# Altium footprint library Zmod.PcbLib: 129 footprints (part 2 of 9)
Each footprint in its own frame and in the unit in brackets; x right, y up, seen from the top. Pads: shape width x height; smd on the part's side, far side on the other; paste and mask are expansions set on the pad; w line width, h text height; cw(c..) or ccw(c..) is an arc to the next point about the centre after c.
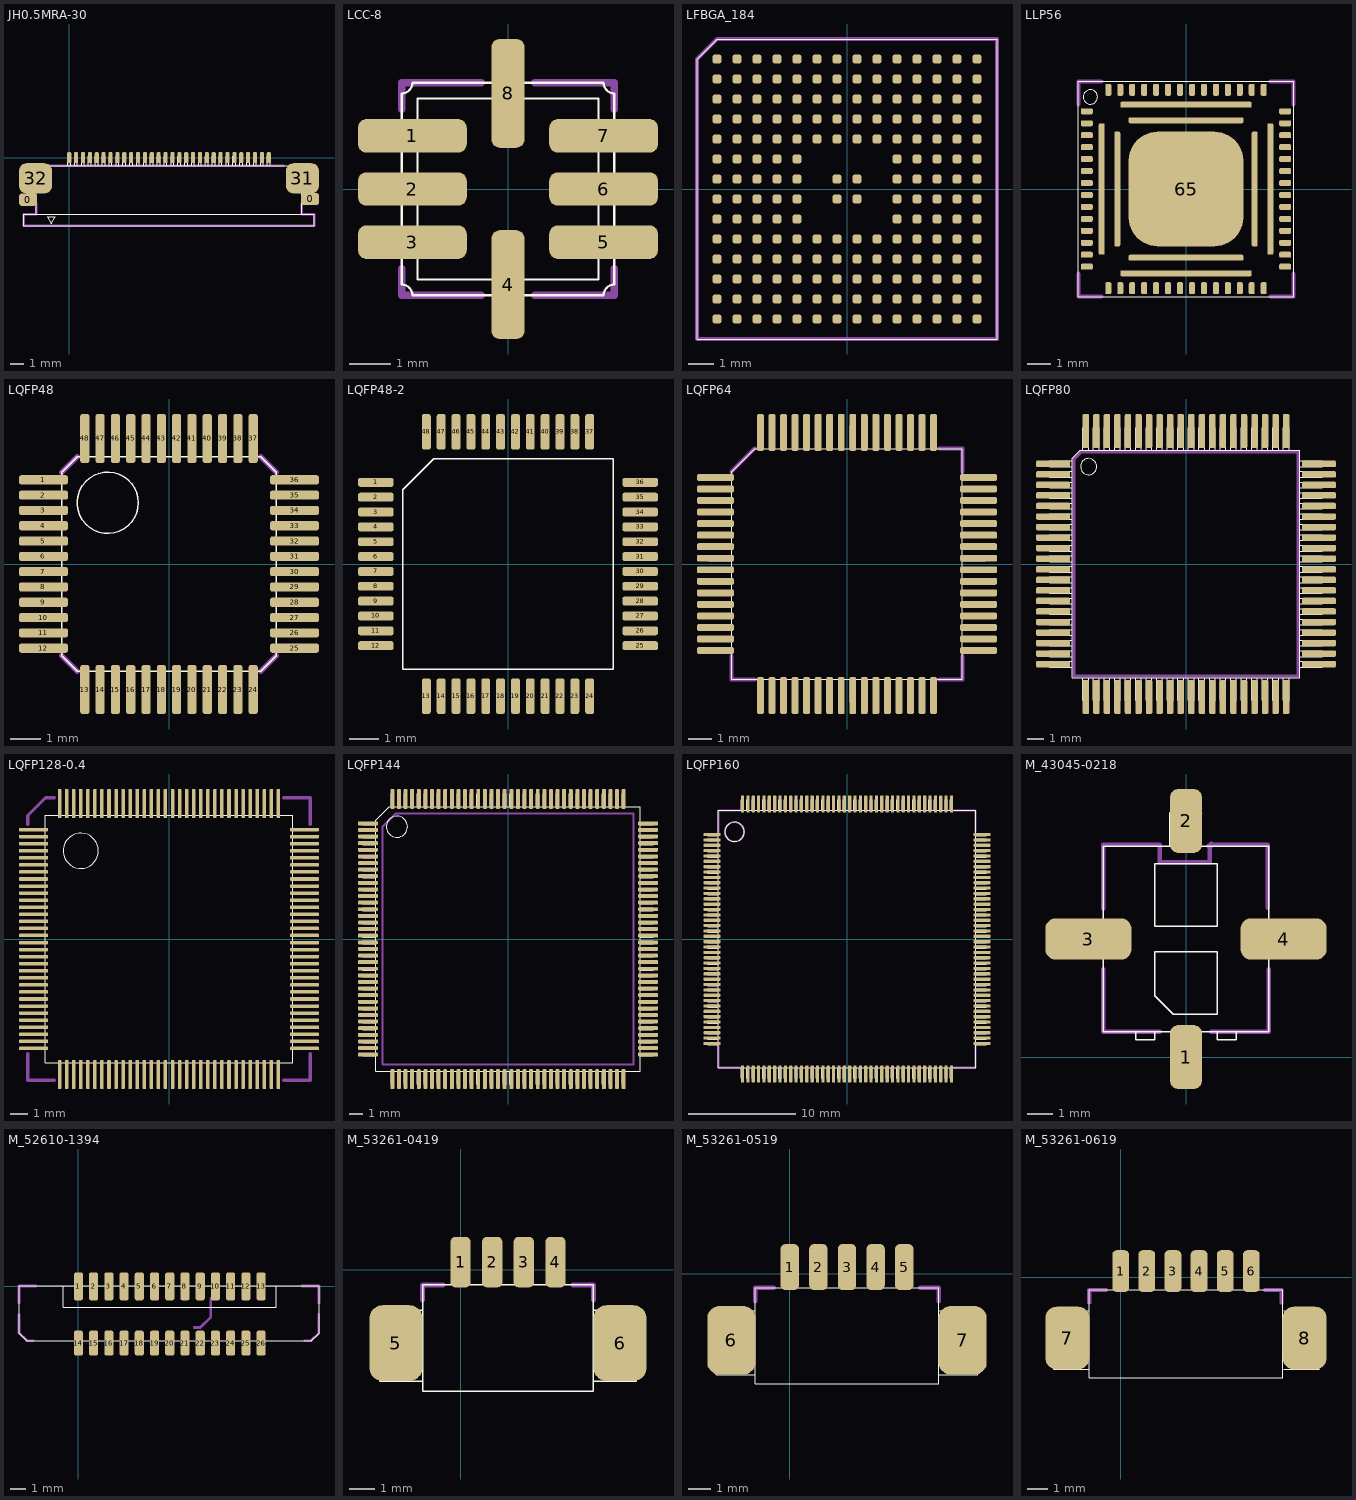
[diagram p1: the footprints below, top view; thin cyan lines are the x and y axes]

## JH0.5MRA-30 [mm]
height 1.778
pads (34):
  rrect50% 1.3x0.9 smd: 0(-3,-3.05) 0(17.5,-3)
  rrect50% 0.3x0.8 smd: 1(0,0) 2(0.5,0) 3(1,0) 4(1.5,0) 5(2,0) 6(2.5,0) 7(3,0) 8(3.5,0) 9(4,0) 10(4.5,0) 11(5,0) 12(5.5,0) 13(6,0) 14(6.5,0) 15(7,0) 16(7.5,0) 17(8,0) 18(8.5,0) 19(9,0) 20(9.5,0) 21(10,0) 22(10.5,0) 23(11,0) 24(11.5,0) 25(12,0) 26(12.5,0) 27(13,0) 28(13.5,0) 29(14,0) 30(14.5,0)
  rrect50% 2.4x2.2 smd: 31(16.95,-1.5) 32(-2.45,-1.5)
Top Overlay:
  lines w0.05: -2.4,-4.1 -2.4,-0.6 16.9,-0.6 16.9,-4.1 ; -2.4,-1.8 -3.1,-1.8 -3.1,-1.6 -2.6,-1.6 -2.6,-1.3 -3.1,-1.3 -3.1,-1.1 -2.6,-1.1 -2.6,-0.7 -2.4,-0.7 ; -0.1,-0.6 -0.1,0.1 0.1,0.1 0.1,-0.6 ; 0.4,-0.6 0.4,0.1 0.6,0.1 0.6,-0.6 ; 0.9,-0.6 0.9,0.1 1.1,0.1 1.1,-0.6 ; 1.4,-0.6 1.4,0.1 1.6,0.1 1.6,-0.6 ; 1.9,-0.6 1.9,0.1 2.1,0.1 2.1,-0.6 ; 2.4,-0.6 2.4,0.1 2.6,0.1 2.6,-0.6 ; 2.9,-0.6 2.9,0.1 3.1,0.1 3.1,-0.6 ; 3.4,-0.6 3.4,0.1 3.6,0.1 3.6,-0.6 ; 3.9,-0.6 3.9,0.1 4.1,0.1 4.1,-0.6 ; 4.4,-0.6 4.4,0.1 4.6,0.1 4.6,-0.6 ; 4.9,-0.6 4.9,0.1 5.1,0.1 5.1,-0.6 ; 5.4,-0.6 5.4,0.1 5.6,0.1 5.6,-0.6 ; 5.9,-0.6 5.9,0.1 6.1,0.1 6.1,-0.6 ; 6.4,-0.6 6.4,0.1 6.6,0.1 6.6,-0.6 ; 6.9,-0.6 6.9,0.1 7.1,0.1 7.1,-0.6 ; 7.4,-0.6 7.4,0.1 7.6,0.1 7.6,-0.6 ; 7.9,-0.6 7.9,0.1 8.1,0.1 8.1,-0.6 ; 8.4,-0.6 8.4,0.1 8.6,0.1 8.6,-0.6 ; 8.9,-0.6 8.9,0.1 9.1,0.1 9.1,-0.6 ; 9.4,-0.6 9.4,0.1 9.6,0.1 9.6,-0.6 ; 9.9,-0.6 9.9,0.1 10.1,0.1 10.1,-0.6 ; 10.4,-0.6 10.4,0.1 10.6,0.1 10.6,-0.6 ; 10.9,-0.6 10.9,0.1 11.1,0.1 11.1,-0.6 ; 11.4,-0.6 11.4,0.1 11.6,0.1 11.6,-0.6 ; 11.9,-0.6 11.9,0.1 12.1,0.1 12.1,-0.6 ; 12.4,-0.6 12.4,0.1 12.6,0.1 12.6,-0.6 ; 12.9,-0.6 12.9,0.1 13.1,0.1 13.1,-0.6 ; 13.4,-0.6 13.4,0.1 13.6,0.1 13.6,-0.6 ; 13.9,-0.6 13.9,0.1 14.1,0.1 14.1,-0.6 ; 14.4,-0.6 14.4,0.1 14.6,0.1 14.6,-0.6 ; 16.9,-1.8 17.6,-1.8 17.6,-1.6 17.1,-1.6 17.1,-1.3 17.6,-1.3 17.6,-1.1 17.1,-1.1 17.1,-0.7 16.9,-0.7 ; -3.3,-4.95 -3.3,-4.1 17.8,-4.1 17.8,-4.95 -3.3,-4.95 ; -1.6,-4.3 -1,-4.3 -1.3,-4.8 -1.6,-4.3
Mechanical 15:
  lines w0.18: -2.4,-3.3 -2.4,-4.1 -3.3,-4.1 -3.3,-4.95 17.8,-4.95 17.8,-4.1 16.9,-4.1 16.9,-3.3 ; -1.65,-0.6 15.55,-0.6
  text ".Designator" at -0.254,-2.794 h1.52

## LCC-8 [mm]
height 1.575
pads (8):
  rrect50% 2.6x0.8 smd paste+0: 1(-2.286,1.27) 2(-2.286,0) 3(-2.286,-1.27) 5(2.286,-1.27) 6(2.286,0) 7(2.286,1.27)
  rrect50% 0.8x2.6 smd paste+0: 4(0,-2.286) 8(0,2.286)
Top Overlay:
  lines w0.05: -2.54,-2.286 cw(c-2.54,-2.54) -2.286,-2.54 -0.254,-2.54 cw(c0,-2.54) 0.254,-2.54 2.286,-2.54 cw(c2.54,-2.54) 2.54,-2.286 2.54,-1.524 cw(c2.54,-1.27) 2.54,-1.016 2.54,-0.254 cw(c2.54,0) 2.54,0.254 2.54,1.016 cw(c2.54,1.27) 2.54,1.524 2.54,2.286 cw(c2.54,2.54) 2.286,2.54 0.254,2.54 cw(c0,2.54) -0.254,2.54 -2.286,2.54 cw(c-2.54,2.54) -2.54,2.286 -2.54,1.524 cw(c-2.54,1.27) -2.54,1.016 -2.54,0.254 cw(c-2.54,0) -2.54,-0.254 -2.54,-1.016 cw(c-2.54,-1.27) -2.54,-1.524 -2.54,-2.286 ; -2.159,-2.159 2.159,-2.159 2.159,2.159 -2.159,2.159 -2.159,-2.159
Mechanical 15:
  lines w0.18: -2.54,-1.905 -2.54,-2.54 -0.635,-2.54 ; -2.54,1.905 -2.54,2.54 -0.635,2.54 ; 0.635,-2.54 2.54,-2.54 2.54,-1.905 ; 0.635,2.54 2.54,2.54 2.54,1.905
  text ".Designator" at -2.286,1.016 h1.5

## LFBGA_184 [mm]
pads (184):
  rrect50% 0.35x0.35 smd paste+0: A1(-5.2,5.2) A2(-4.4,5.2) A3(-3.6,5.2) A4(-2.8,5.2) A5(-2,5.2) A6(-1.2,5.2) A7(-0.4,5.2) A8(0.4,5.2) A9(1.2,5.2) A10(2,5.2) A11(2.8,5.2) A12(3.6,5.2) A13(4.4,5.2) A14(5.2,5.2) B1(-5.2,4.4) B2(-4.4,4.4) B3(-3.6,4.4) B4(-2.8,4.4) B5(-2,4.4) B6(-1.2,4.4) B7(-0.4,4.4) B8(0.4,4.4) B9(1.2,4.4) B10(2,4.4) B11(2.8,4.4) B12(3.6,4.4) B13(4.4,4.4) B14(5.2,4.4) C1(-5.2,3.6) C2(-4.4,3.6) C3(-3.6,3.6) C4(-2.8,3.6) C5(-2,3.6) C6(-1.2,3.6) C7(-0.4,3.6) C8(0.4,3.6) C9(1.2,3.6) C10(2,3.6) C11(2.8,3.6) C12(3.6,3.6) C13(4.4,3.6) C14(5.2,3.6) D1(-5.2,2.8) D2(-4.4,2.8) D3(-3.6,2.8) D4(-2.8,2.8) D5(-2,2.8) D6(-1.2,2.8) D7(-0.4,2.8) D8(0.4,2.8) D9(1.2,2.8) D10(2,2.8) D11(2.8,2.8) D12(3.6,2.8) D13(4.4,2.8) D14(5.2,2.8) E1(-5.2,2) E2(-4.4,2) E3(-3.6,2) E4(-2.8,2) E5(-2,2) E6(-1.2,2) E7(-0.4,2) E8(0.4,2) E9(1.2,2) E10(2,2) E11(2.8,2) E12(3.6,2) E13(4.4,2) E14(5.2,2) F1(-5.2,1.2) F2(-4.4,1.2) F3(-3.6,1.2) F4(-2.8,1.2) F5(-2,1.2) F10(2,1.2) F11(2.8,1.2) F12(3.6,1.2) F13(4.4,1.2) F14(5.2,1.2) G1(-5.2,0.4) G2(-4.4,0.4) G3(-3.6,0.4) G4(-2.8,0.4) G5(-2,0.4) G7(-0.4,0.4) G8(0.4,0.4) G10(2,0.4) G11(2.8,0.4) G12(3.6,0.4) G13(4.4,0.4) G14(5.2,0.4) H1(-5.2,-0.4) H2(-4.4,-0.4) H3(-3.6,-0.4) H4(-2.8,-0.4) H5(-2,-0.4) H7(-0.4,-0.4) H8(0.4,-0.4) H10(2,-0.4) H11(2.8,-0.4) H12(3.6,-0.4) H13(4.4,-0.4) H14(5.2,-0.4) J1(-5.2,-1.2) J2(-4.4,-1.2) J3(-3.6,-1.2) J4(-2.8,-1.2) J5(-2,-1.2) J10(2,-1.2) J11(2.8,-1.2) J12(3.6,-1.2) J13(4.4,-1.2) J14(5.2,-1.2) K1(-5.2,-2) K2(-4.4,-2) K3(-3.6,-2) K4(-2.8,-2) K5(-2,-2) K6(-1.2,-2) K7(-0.4,-2) K8(0.4,-2) K9(1.2,-2) K10(2,-2) K11(2.8,-2) K12(3.6,-2) K13(4.4,-2) K14(5.2,-2) L1(-5.2,-2.8) L2(-4.4,-2.8) L3(-3.6,-2.8) L4(-2.8,-2.8) L5(-2,-2.8) L6(-1.2,-2.8) L7(-0.4,-2.8) L8(0.4,-2.8) L9(1.2,-2.8) L10(2,-2.8) L11(2.8,-2.8) L12(3.6,-2.8) L13(4.4,-2.8) L14(5.2,-2.8) M1(-5.2,-3.6) M2(-4.4,-3.6) M3(-3.6,-3.6) M4(-2.8,-3.6) M5(-2,-3.6) M6(-1.2,-3.6) M7(-0.4,-3.6) M8(0.4,-3.6) M9(1.2,-3.6) M10(2,-3.6) M11(2.8,-3.6) M12(3.6,-3.6) M13(4.4,-3.6) M14(5.2,-3.6) N1(-5.2,-4.4) N2(-4.4,-4.4) N3(-3.6,-4.4) N4(-2.8,-4.4) N5(-2,-4.4) N6(-1.2,-4.4) N7(-0.4,-4.4) N8(0.4,-4.4) N9(1.2,-4.4) N10(2,-4.4) N11(2.8,-4.4) N12(3.6,-4.4) N13(4.4,-4.4) N14(5.2,-4.4) P1(-5.2,-5.2) P2(-4.4,-5.2) P3(-3.6,-5.2) P4(-2.8,-5.2) P5(-2,-5.2) P6(-1.2,-5.2) P7(-0.4,-5.2) P8(0.4,-5.2) P9(1.2,-5.2) P10(2,-5.2) P11(2.8,-5.2) P12(3.6,-5.2) P13(4.4,-5.2) P14(5.2,-5.2)
Top Overlay:
  lines w0.05: -6,-6 6,-6 6,6 -5.2,6 -6,5.2 -6,-6
Mechanical 15:
  lines w0.18: -6,-6 6,-6 6,6 -5.2,6 -6,5.2 -6,-6
  text ".Designator" at -5.08,3.302 h1.5

## LLP56 [mm]
height 0.635
pads (65):
  rrect50% 0.5x0.25 smd paste+0: 1(-4.15,3.25) 2(-4.15,2.75) 3(-4.15,2.25) 4(-4.15,1.75) 5(-4.15,1.25) 6(-4.15,0.75) 7(-4.15,0.25) 8(-4.15,-0.25) 9(-4.15,-0.75) 10(-4.15,-1.25) 11(-4.15,-1.75) 12(-4.15,-2.25) 13(-4.15,-2.75) 14(-4.15,-3.25) 29(4.15,-3.25) 30(4.15,-2.75) 31(4.15,-2.25) 32(4.15,-1.75) 33(4.15,-1.25) 34(4.15,-0.75) 35(4.15,-0.25) 36(4.15,0.25) 37(4.15,0.75) 38(4.15,1.25) 39(4.15,1.75) 40(4.15,2.25) 41(4.15,2.75) 42(4.15,3.25)
  rrect50% 0.25x0.5 smd paste+0: 15(-3.25,-4.15) 16(-2.75,-4.15) 17(-2.25,-4.15) 18(-1.75,-4.15) 19(-1.25,-4.15) 20(-0.75,-4.15) 21(-0.25,-4.15) 22(0.25,-4.15) 23(0.75,-4.15) 24(1.25,-4.15) 25(1.75,-4.15) 26(2.25,-4.15) 27(2.75,-4.15) 28(3.25,-4.15) 43(3.25,4.15) 44(2.75,4.15) 45(2.25,4.15) 46(1.75,4.15) 47(1.25,4.15) 48(0.75,4.15) 49(0.25,4.15) 50(-0.25,4.15) 51(-0.75,4.15) 52(-1.25,4.15) 53(-1.75,4.15) 54(-2.25,4.15) 55(-2.75,4.15) 56(-3.25,4.15)
  rrect50% 0.25x5.5 smd paste+0: 57(-3.525,0) 61(3.525,0)
  rrect50% 0.25x4.8 smd paste+0: 58(-2.875,0) 62(2.875,0)
  rrect50% 5.5x0.25 smd paste+0: 59(0,3.525) 63(0,-3.525)
  rrect50% 4.8x0.25 smd paste+0: 60(0,2.875) 64(0,-2.875)
  rrect50% 4.8x4.8 smd paste+0: 65(0,0)
Top Overlay:
  circle w0.05: c-4,3.85 r0.3
  lines w0.05: -4.5,-4.5 -4.5,4.5 4.5,4.5 4.5,-4.5 -4.5,-4.5
Top Solder:
  circle w0.25: c-1.905,-1.905 r0.381
  circle w0.25: c-0.635,-1.905 r0.381
  circle w0.25: c0.635,-1.905 r0.381
  circle w0.25: c1.905,-1.905 r0.381
  circle w0.25: c-0.635,0.635 r0.381
  circle w0.25: c-1.905,0.635 r0.381
  circle w0.25: c-1.905,1.905 r0.381
  circle w0.25: c-0.635,1.905 r0.381
  circle w0.25: c0.635,1.905 r0.381
  circle w0.25: c1.905,1.905 r0.381
  circle w0.25: c1.905,0.635 r0.381
  circle w0.25: c0.635,0.635 r0.381
  circle w0.25: c-1.905,-0.635 r0.381
  circle w0.25: c1.905,-0.635 r0.381
  circle w0.25: c0.635,-0.635 r0.381
  circle w0.25: c-0.635,-0.635 r0.381
Mechanical 15:
  lines w0.18: -4.5,-3.55 -4.5,-4.5 -3.55,-4.5 ; -4.5,3.55 -4.5,4.5 -3.55,4.5 ; 3.55,-4.5 4.5,-4.5 4.5,-3.55 ; 3.55,4.5 4.5,4.5 4.5,3.55
  text ".Designator" at -3.937,2.667 h1.5

## LQFP48 [mm]
height 1.397
pads (48):
  rrect50% 1.6x0.3 smd paste+0: 1(-4.1,2.75) 2(-4.1,2.25) 3(-4.1,1.75) 4(-4.1,1.25) 5(-4.1,0.75) 6(-4.1,0.25) 7(-4.1,-0.25) 8(-4.1,-0.75) 9(-4.1,-1.25) 10(-4.1,-1.75) 11(-4.1,-2.25) 12(-4.1,-2.75) 25(4.1,-2.75) 26(4.1,-2.25) 27(4.1,-1.75) 28(4.1,-1.25) 29(4.1,-0.75) 30(4.1,-0.25) 31(4.1,0.25) 32(4.1,0.75) 33(4.1,1.25) 34(4.1,1.75) 35(4.1,2.25) 36(4.1,2.75)
  rrect50% 0.3x1.6 smd paste+0: 13(-2.75,-4.1) 14(-2.25,-4.1) 15(-1.75,-4.1) 16(-1.25,-4.1) 17(-0.75,-4.1) 18(-0.25,-4.1) 19(0.25,-4.1) 20(0.75,-4.1) 21(1.25,-4.1) 22(1.75,-4.1) 23(2.25,-4.1) 24(2.75,-4.1) 37(2.75,4.1) 38(2.25,4.1) 39(1.75,4.1) 40(1.25,4.1) 41(0.75,4.1) 42(0.25,4.1) 43(-0.25,4.1) 44(-0.75,4.1) 45(-1.25,4.1) 46(-1.75,4.1) 47(-2.25,4.1) 48(-2.75,4.1)
Top Overlay:
  circle w0.05: c-2,2 r1
  lines w0.05: -3.5,-3 -3,-3.5 3,-3.5 3.5,-3 3.5,3 3,3.5 -3,3.5 -3.5,3 -3.5,-3
Mechanical 15:
  lines w0.18: -3.5,-3 -3,-3.5 ; -3.5,3 -3,3.5 ; 3,-3.5 3.5,-3 ; 3,3.5 3.5,3
  text ".Designator" at -2.921,1.524 h1.5

## LQFP48-2 [mm] "Rev.1"
height 0.5
pads (48):
  rrect50% 1.2x0.3 smd: 1(-4.45,2.75) 2(-4.45,2.25) 3(-4.45,1.75) 4(-4.45,1.25) 5(-4.45,0.75) 6(-4.45,0.25) 7(-4.45,-0.25) 8(-4.45,-0.75) 9(-4.45,-1.25) 10(-4.45,-1.75) 11(-4.45,-2.25) 12(-4.45,-2.75) 25(4.45,-2.75) 26(4.45,-2.25) 27(4.45,-1.75) 28(4.45,-1.25) 29(4.45,-0.75) 30(4.45,-0.25) 31(4.45,0.25) 32(4.45,0.75) 33(4.45,1.25) 34(4.45,1.75) 35(4.45,2.25) 36(4.45,2.75)
  rrect50% 0.3x1.2 smd: 13(-2.75,-4.45) 14(-2.25,-4.45) 15(-1.75,-4.45) 16(-1.25,-4.45) 17(-0.75,-4.45) 18(-0.25,-4.45) 19(0.25,-4.45) 20(0.75,-4.45) 21(1.25,-4.45) 22(1.75,-4.45) 23(2.25,-4.45) 24(2.75,-4.45) 37(2.75,4.45) 38(2.25,4.45) 39(1.75,4.45) 40(1.25,4.45) 41(0.75,4.45) 42(0.25,4.45) 43(-0.25,4.45) 44(-0.75,4.45) 45(-1.25,4.45) 46(-1.75,4.45) 47(-2.25,4.45) 48(-2.75,4.45)
Top Overlay:
  lines w0.05: -3.54,-3.54 -3.54,2.505 -2.505,3.54 3.54,3.54 3.54,-3.54 -3.54,-3.54

## LQFP64 [mm]
height 1.397
pads (64):
  rrect50% 1.6x0.3 smd paste+0: 1(-5.7,3.75) 2(-5.7,3.25) 3(-5.7,2.75) 4(-5.7,2.25) 5(-5.7,1.75) 6(-5.7,1.25) 7(-5.7,0.75) 8(-5.7,0.25) 9(-5.7,-0.25) 10(-5.7,-0.75) 11(-5.7,-1.25) 12(-5.7,-1.75) 13(-5.7,-2.25) 14(-5.7,-2.75) 15(-5.7,-3.25) 16(-5.7,-3.75) 33(5.7,-3.75) 34(5.7,-3.25) 35(5.7,-2.75) 36(5.7,-2.25) 37(5.7,-1.75) 38(5.7,-1.25) 39(5.7,-0.75) 40(5.7,-0.25) 41(5.7,0.25) 42(5.7,0.75) 43(5.7,1.25) 44(5.7,1.75) 45(5.7,2.25) 46(5.7,2.75) 47(5.7,3.25) 48(5.7,3.75)
  rrect50% 0.3x1.6 smd paste+0: 17(-3.75,-5.7) 18(-3.25,-5.7) 19(-2.75,-5.7) 20(-2.25,-5.7) 21(-1.75,-5.7) 22(-1.25,-5.7) 23(-0.75,-5.7) 24(-0.25,-5.7) 25(0.25,-5.7) 26(0.75,-5.7) 27(1.25,-5.7) 28(1.75,-5.7) 29(2.25,-5.7) 30(2.75,-5.7) 31(3.25,-5.7) 32(3.75,-5.7) 49(3.75,5.7) 50(3.25,5.7) 51(2.75,5.7) 52(2.25,5.7) 53(1.75,5.7) 54(1.25,5.7) 55(0.75,5.7) 56(0.25,5.7) 57(-0.25,5.7) 58(-0.75,5.7) 59(-1.25,5.7) 60(-1.75,5.7) 61(-2.25,5.7) 62(-2.75,5.7) 63(-3.25,5.7) 64(-3.75,5.7)
Top Overlay:
  drawing of 197 lines, arcs and shapes, not listed
Mechanical 15:
  lines w0.18: -5,-4 -5,-5 -4,-5 ; -5,4 -4,5 ; 4,-5 5,-5 5,-4 ; 4,5 5,5 5,4
  text ".Designator" at -4.699,2.921 h1.5

## LQFP80 [mm]
height 1.524
pads (80):
  rrect50% 2.1x0.4 smd paste+0: 1(-8.19,6.175) 2(-8.19,5.525) 3(-8.19,4.875) 4(-8.19,4.225) 5(-8.19,3.575) 6(-8.19,2.925) 7(-8.19,2.275) 8(-8.19,1.625) 9(-8.19,0.975) 10(-8.19,0.325) 11(-8.19,-0.325) 12(-8.19,-0.975) 13(-8.19,-1.625) 14(-8.19,-2.275) 15(-8.19,-2.925) 16(-8.19,-3.575) 17(-8.19,-4.225) 18(-8.19,-4.875) 19(-8.19,-5.525) 20(-8.19,-6.175) 41(8.19,-6.175) 42(8.19,-5.525) 43(8.19,-4.875) 44(8.19,-4.225) 45(8.19,-3.575) 46(8.19,-2.925) 47(8.19,-2.275) 48(8.19,-1.625) 49(8.19,-0.975) 50(8.19,-0.325) 51(8.19,0.325) 52(8.19,0.975) 53(8.19,1.625) 54(8.19,2.275) 55(8.19,2.925) 56(8.19,3.575) 57(8.19,4.225) 58(8.19,4.875) 59(8.19,5.525) 60(8.19,6.175)
  rrect50% 0.4x2.1 smd paste+0: 21(-6.175,-8.19) 22(-5.525,-8.19) 23(-4.875,-8.19) 24(-4.225,-8.19) 25(-3.575,-8.19) 26(-2.925,-8.19) 27(-2.275,-8.19) 28(-1.625,-8.19) 29(-0.975,-8.19) 30(-0.325,-8.19) 31(0.325,-8.19) 32(0.975,-8.19) 33(1.625,-8.19) 34(2.275,-8.19) 35(2.925,-8.19) 36(3.575,-8.19) 37(4.225,-8.19) 38(4.875,-8.19) 39(5.525,-8.19) 40(6.175,-8.19) 61(6.175,8.19) 62(5.525,8.19) 63(4.875,8.19) 64(4.225,8.19) 65(3.575,8.19) 66(2.925,8.19) 67(2.275,8.19) 68(1.625,8.19) 69(0.975,8.19) 70(0.325,8.19) 71(-0.325,8.19) 72(-0.975,8.19) 73(-1.625,8.19) 74(-2.275,8.19) 75(-2.925,8.19) 76(-3.575,8.19) 77(-4.225,8.19) 78(-4.875,8.19) 79(-5.525,8.19) 80(-6.175,8.19)
Top Overlay:
  drawing of 246 lines, arcs and shapes, not listed
Mechanical 15:
  lines w0.18: -6.9,-6.9 6.9,-6.9 6.9,6.9 -6.45,6.9 -6.9,6.45 -6.9,-6.9
  text ".Designator" at -5.969,3.937 h1.5

## LQFP128-0.4 [mm]
height 1.524
pads (128):
  rrect50% 1.65x0.2 smd paste+0: 1(-7.675,6.2) 2(-7.675,5.8) 3(-7.675,5.4) 4(-7.675,5) 5(-7.675,4.6) 6(-7.675,4.2) 7(-7.675,3.8) 8(-7.675,3.4) 9(-7.675,3) 10(-7.675,2.6) 11(-7.675,2.2) 12(-7.675,1.8) 13(-7.675,1.4) 14(-7.675,1) 15(-7.675,0.6) 16(-7.675,0.2) 17(-7.675,-0.2) 18(-7.675,-0.6) 19(-7.675,-1) 20(-7.675,-1.4) 21(-7.675,-1.8) 22(-7.675,-2.2) 23(-7.675,-2.6) 24(-7.675,-3) 25(-7.675,-3.4) 26(-7.675,-3.8) 27(-7.675,-4.2) 28(-7.675,-4.6) 29(-7.675,-5) 30(-7.675,-5.4) 31(-7.675,-5.8) 32(-7.675,-6.2) 65(7.675,-6.2) 66(7.675,-5.8) 67(7.675,-5.4) 68(7.675,-5) 69(7.675,-4.6) 70(7.675,-4.2) 71(7.675,-3.8) 72(7.675,-3.4) 73(7.675,-3) 74(7.675,-2.6) 75(7.675,-2.2) 76(7.675,-1.8) 77(7.675,-1.4) 78(7.675,-1) 79(7.675,-0.6) 80(7.675,-0.2) 81(7.675,0.2) 82(7.675,0.6) 83(7.675,1) 84(7.675,1.4) 85(7.675,1.8) 86(7.675,2.2) 87(7.675,2.6) 88(7.675,3) 89(7.675,3.4) 90(7.675,3.8) 91(7.675,4.2) 92(7.675,4.6) 93(7.675,5) 94(7.675,5.4) 95(7.675,5.8) 96(7.675,6.2)
  rrect50% 0.2x1.65 smd paste+0: 33(-6.2,-7.675) 34(-5.8,-7.675) 35(-5.4,-7.675) 36(-5,-7.675) 37(-4.6,-7.675) 38(-4.2,-7.675) 39(-3.8,-7.675) 40(-3.4,-7.675) 41(-3,-7.675) 42(-2.6,-7.675) 43(-2.2,-7.675) 44(-1.8,-7.675) 45(-1.4,-7.675) 46(-1,-7.675) 47(-0.6,-7.675) 48(-0.2,-7.675) 49(0.2,-7.675) 50(0.6,-7.675) 51(1,-7.675) 52(1.4,-7.675) 53(1.8,-7.675) 54(2.2,-7.675) 55(2.6,-7.675) 56(3,-7.675) 57(3.4,-7.675) 58(3.8,-7.675) 59(4.2,-7.675) 60(4.6,-7.675) 61(5,-7.675) 62(5.4,-7.675) 63(5.8,-7.675) 64(6.2,-7.675) 97(6.2,7.675) 98(5.8,7.675) 99(5.4,7.675) 100(5,7.675) 101(4.6,7.675) 102(4.2,7.675) 103(3.8,7.675) 104(3.4,7.675) 105(3,7.675) 106(2.6,7.675) 107(2.2,7.675) 108(1.8,7.675) 109(1.4,7.675) 110(1,7.675) 111(0.6,7.675) 112(0.2,7.675) 113(-0.2,7.675) 114(-0.6,7.675) 115(-1,7.675) 116(-1.4,7.675) 117(-1.8,7.675) 118(-2.2,7.675) 119(-2.6,7.675) 120(-3,7.675) 121(-3.4,7.675) 122(-3.8,7.675) 123(-4.2,7.675) 124(-4.6,7.675) 125(-5,7.675) 126(-5.4,7.675) 127(-5.8,7.675) 128(-6.2,7.675)
Top Overlay:
  circle w0.05: c-5,5 r1
  lines w0.05: -7,-7 7,-7 7,7 -7,7 -7,-7
Mechanical 15:
  lines w0.18: -8,-6.5 -8,-8 -6.5,-8 ; -8,6.5 -8,7 -7,8 -6.5,8 ; 6.5,-8 8,-8 8,-6.5 ; 6.5,8 8,8 8,6.5
  text ".Designator" at -6.223,4.318 h1.5

## LQFP144 [mm]
height 1.524
pads (144):
  rrect50% 1.5x0.3 smd paste+0: 1(-10.6,8.75) 2(-10.6,8.25) 3(-10.6,7.75) 4(-10.6,7.25) 5(-10.6,6.75) 6(-10.6,6.25) 7(-10.6,5.75) 8(-10.6,5.25) 9(-10.6,4.75) 10(-10.6,4.25) 11(-10.6,3.75) 12(-10.6,3.25) 13(-10.6,2.75) 14(-10.6,2.25) 15(-10.6,1.75) 16(-10.6,1.25) 17(-10.6,0.75) 18(-10.6,0.25) 19(-10.6,-0.25) 20(-10.6,-0.75) 21(-10.6,-1.25) 22(-10.6,-1.75) 23(-10.6,-2.25) 24(-10.6,-2.75) 25(-10.6,-3.25) 26(-10.6,-3.75) 27(-10.6,-4.25) 28(-10.6,-4.75) 29(-10.6,-5.25) 30(-10.6,-5.75) 31(-10.6,-6.25) 32(-10.6,-6.75) 33(-10.6,-7.25) 34(-10.6,-7.75) 35(-10.6,-8.25) 36(-10.6,-8.75) 73(10.6,-8.75) 74(10.6,-8.25) 75(10.6,-7.75) 76(10.6,-7.25) 77(10.6,-6.75) 78(10.6,-6.25) 79(10.6,-5.75) 80(10.6,-5.25) 81(10.6,-4.75) 82(10.6,-4.25) 83(10.6,-3.75) 84(10.6,-3.25) 85(10.6,-2.75) 86(10.6,-2.25) 87(10.6,-1.75) 88(10.6,-1.25) 89(10.6,-0.75) 90(10.6,-0.25) 91(10.6,0.25) 92(10.6,0.75) 93(10.6,1.25) 94(10.6,1.75) 95(10.6,2.25) 96(10.6,2.75) 97(10.6,3.25) 98(10.6,3.75) 99(10.6,4.25) 100(10.6,4.75) 101(10.6,5.25) 102(10.6,5.75) 103(10.6,6.25) 104(10.6,6.75) 105(10.6,7.25) 106(10.6,7.75) 107(10.6,8.25) 108(10.6,8.75)
  rrect50% 0.3x1.5 smd paste+0: 37(-8.75,-10.6) 38(-8.25,-10.6) 39(-7.75,-10.6) 40(-7.25,-10.6) 41(-6.75,-10.6) 42(-6.25,-10.6) 43(-5.75,-10.6) 44(-5.25,-10.6) 45(-4.75,-10.6) 46(-4.25,-10.6) 47(-3.75,-10.6) 48(-3.25,-10.6) 49(-2.75,-10.6) 50(-2.25,-10.6) 51(-1.75,-10.6) 52(-1.25,-10.6) 53(-0.75,-10.6) 54(-0.25,-10.6) 55(0.25,-10.6) 56(0.75,-10.6) 57(1.25,-10.6) 58(1.75,-10.6) 59(2.25,-10.6) 60(2.75,-10.6) 61(3.25,-10.6) 62(3.75,-10.6) 63(4.25,-10.6) 64(4.75,-10.6) 65(5.25,-10.6) 66(5.75,-10.6) 67(6.25,-10.6) 68(6.75,-10.6) 69(7.25,-10.6) 70(7.75,-10.6) 71(8.25,-10.6) 72(8.75,-10.6) 109(8.75,10.6) 110(8.25,10.6) 111(7.75,10.6) 112(7.25,10.6) 113(6.75,10.6) 114(6.25,10.6) 115(5.75,10.6) 116(5.25,10.6) 117(4.75,10.6) 118(4.25,10.6) 119(3.75,10.6) 120(3.25,10.6) 121(2.75,10.6) 122(2.25,10.6) 123(1.75,10.6) 124(1.25,10.6) 125(0.75,10.6) 126(0.25,10.6) 127(-0.25,10.6) 128(-0.75,10.6) 129(-1.25,10.6) 130(-1.75,10.6) 131(-2.25,10.6) 132(-2.75,10.6) 133(-3.25,10.6) 134(-3.75,10.6) 135(-4.25,10.6) 136(-4.75,10.6) 137(-5.25,10.6) 138(-5.75,10.6) 139(-6.25,10.6) 140(-6.75,10.6) 141(-7.25,10.6) 142(-7.75,10.6) 143(-8.25,10.6) 144(-8.75,10.6)
Top Overlay:
  drawing of 438 lines, arcs and shapes, not listed
Mechanical 15:
  lines w0.18: -9.5,-9.5 -9.5,8.5 -8.5,9.5 9.5,9.5 9.5,-9.5 -9.5,-9.5
  text ".Designator" at -7.239,5.969 h1.5

## LQFP160 [mm]
height 1.524
pads (160):
  rrect50% 1.6x0.3 smd paste+0: 1(-12.6,9.75) 2(-12.6,9.25) 3(-12.6,8.75) 4(-12.6,8.25) 5(-12.6,7.75) 6(-12.6,7.25) 7(-12.6,6.75) 8(-12.6,6.25) 9(-12.6,5.75) 10(-12.6,5.25) 11(-12.6,4.75) 12(-12.6,4.25) 13(-12.6,3.75) 14(-12.6,3.25) 15(-12.6,2.75) 16(-12.6,2.25) 17(-12.6,1.75) 18(-12.6,1.25) 19(-12.6,0.75) 20(-12.6,0.25) 21(-12.6,-0.25) 22(-12.6,-0.75) 23(-12.6,-1.25) 24(-12.6,-1.75) 25(-12.6,-2.25) 26(-12.6,-2.75) 27(-12.6,-3.25) 28(-12.6,-3.75) 29(-12.6,-4.25) 30(-12.6,-4.75) 31(-12.6,-5.25) 32(-12.6,-5.75) 33(-12.6,-6.25) 34(-12.6,-6.75) 35(-12.6,-7.25) 36(-12.6,-7.75) 37(-12.6,-8.25) 38(-12.6,-8.75) 39(-12.6,-9.25) 40(-12.6,-9.75) 81(12.6,-9.75) 82(12.6,-9.25) 83(12.6,-8.75) 84(12.6,-8.25) 85(12.6,-7.75) 86(12.6,-7.25) 87(12.6,-6.75) 88(12.6,-6.25) 89(12.6,-5.75) 90(12.6,-5.25) 91(12.6,-4.75) 92(12.6,-4.25) 93(12.6,-3.75) 94(12.6,-3.25) 95(12.6,-2.75) 96(12.6,-2.25) 97(12.6,-1.75) 98(12.6,-1.25) 99(12.6,-0.75) 100(12.6,-0.25) 101(12.6,0.25) 102(12.6,0.75) 103(12.6,1.25) 104(12.6,1.75) 105(12.6,2.25) 106(12.6,2.75) 107(12.6,3.25) 108(12.6,3.75) 109(12.6,4.25) 110(12.6,4.75) 111(12.6,5.25) 112(12.6,5.75) 113(12.6,6.25) 114(12.6,6.75) 115(12.6,7.25) 116(12.6,7.75) 117(12.6,8.25) 118(12.6,8.75) 119(12.6,9.25) 120(12.6,9.75)
  rrect50% 0.3x1.6 smd paste+0: 41(-9.75,-12.6) 42(-9.25,-12.6) 43(-8.75,-12.6) 44(-8.25,-12.6) 45(-7.75,-12.6) 46(-7.25,-12.6) 47(-6.75,-12.6) 48(-6.25,-12.6) 49(-5.75,-12.6) 50(-5.25,-12.6) 51(-4.75,-12.6) 52(-4.25,-12.6) 53(-3.75,-12.6) 54(-3.25,-12.6) 55(-2.75,-12.6) 56(-2.25,-12.6) 57(-1.75,-12.6) 58(-1.25,-12.6) 59(-0.75,-12.6) 60(-0.25,-12.6) 61(0.25,-12.6) 62(0.75,-12.6) 63(1.25,-12.6) 64(1.75,-12.6) 65(2.25,-12.6) 66(2.75,-12.6) 67(3.25,-12.6) 68(3.75,-12.6) 69(4.25,-12.6) 70(4.75,-12.6) 71(5.25,-12.6) 72(5.75,-12.6) 73(6.25,-12.6) 74(6.75,-12.6) 75(7.25,-12.6) 76(7.75,-12.6) 77(8.25,-12.6) 78(8.75,-12.6) 79(9.25,-12.6) 80(9.75,-12.6) 121(9.75,12.6) 122(9.25,12.6) 123(8.75,12.6) 124(8.25,12.6) 125(7.75,12.6) 126(7.25,12.6) 127(6.75,12.6) 128(6.25,12.6) 129(5.75,12.6) 130(5.25,12.6) 131(4.75,12.6) 132(4.25,12.6) 133(3.75,12.6) 134(3.25,12.6) 135(2.75,12.6) 136(2.25,12.6) 137(1.75,12.6) 138(1.25,12.6) 139(0.75,12.6) 140(0.25,12.6) 141(-0.25,12.6) 142(-0.75,12.6) 143(-1.25,12.6) 144(-1.75,12.6) 145(-2.25,12.6) 146(-2.75,12.6) 147(-3.25,12.6) 148(-3.75,12.6) 149(-4.25,12.6) 150(-4.75,12.6) 151(-5.25,12.6) 152(-5.75,12.6) 153(-6.25,12.6) 154(-6.75,12.6) 155(-7.25,12.6) 156(-7.75,12.6) 157(-8.25,12.6) 158(-8.75,12.6) 159(-9.25,12.6) 160(-9.75,12.6)
Mid-Layer 4:
  lines w0.051: -14,-14 -14,14 14,14 14,-14 -14,-14
Top Overlay:
  drawing of 485 lines, arcs and shapes, not listed
Mechanical 15:
  circle w0.18: c-10.5,10 r0.9
  lines w0.18: -12,-10 -12,-12 -10,-12 ; -12,10 -12,12 -10,12 ; 10,-12 12,-12 12,-10 ; 10,12 12,12 12,10
  text ".Designator" at -6.858,8.128 h1.5

## M_43045-0218 [mm] "Molex 43045-0281 series 0 mm pitch, 2 way, plug, Rev. 1"
height 9.9
pads (4):
  rrect50% 1.27x2.54 smd paste+0: 1(0,0) 2(0,9.4)
  rrect50% 3.43x1.65 smd: 3(-3.885,4.7) 4(3.885,4.7)
Top Overlay:
  lines w0.05: -3.3,4.275 -4.975,4.275 -4.975,5.125 -3.3,5.125 ; -2,1 -2,0.7 -1.25,0.7 -1.25,1 ; -0.65,8.4 -0.65,9.7 -0.625,9.725 0.625,9.725 0.6,9.7 0.6,8.4 ; -0.45,0.975 -0.45,-0.7 0.4,-0.7 0.4,0.975 ; 1.25,1 1.25,0.7 2,0.7 2,1 ; 3.3,4.325 4.975,4.325 4.975,5.175 3.3,5.175 ; -3.3,1 -3.3,8.4 3.3,8.4 3.3,1 -3.3,1 ; -1.25,2.45 -1.25,4.2 1.25,4.2 1.25,1.7 -0.5,1.7 -1.25,2.45 ; -1.25,5.2 1.25,5.2 1.25,7.7 -1.25,7.7 -1.25,5.2
Mechanical 15:
  lines w0.18: -3.3,3.5 -3.3,1 -1.05,1 ; -3.3,5.9 -3.3,8.4 ; -3.3,8.45 -1.05,8.45 -1.05,7.75 0.95,7.75 0.95,8.4 ; 1,1 3.25,1 ; 1,8.45 3.25,8.45 3.25,5.95 ; 3.3,1 3.3,3.5
  lines w0.254: 0.95,8.4 1,8.45
  text ".Designator" at -1.75,4.2 h1.5

## M_52610-1394 [mm] "Molex 52610 series 1 mm pitch, 30 way, receptacle. Rev. 1"
height 7.25
pads (26):
  rrect50% 0.6x1.85 smd paste+0: 1(0,0) 2(1,0) 3(2,0) 4(3,0) 5(4,0) 6(5,-0.001) 7(6,0) 8(7,0) 9(8,0) 10(9,0) 11(10,0) 12(11,0) 13(12,-0.001)
  rrect50% 0.6x1.65 smd paste+0: 14(0,-3.725) 15(1,-3.725) 16(2,-3.725) 17(3,-3.725) 18(4,-3.725) 19(5,-3.725) 20(6,-3.725) 21(7,-3.725) 22(8,-3.725) 23(9,-3.725) 24(10,-3.725) 25(11,-3.725) 26(12,-3.725)
Top Overlay:
  lines w0.05: -1,0.037 -1,-1.363 13,-1.363 13,0.037 ; -3.9,-3.063 -3.9,-0.663 -3.9,0.037 15.8,0.037 15.8,-3.063 15.3,-3.562 -3.4,-3.562 -3.6,-3.363 -3.9,-3.063
Mechanical 15:
  lines w0.18: -3.9,-1.85 -3.9,-3.05 -3.387,-3.562 -2.987,-3.562 ; -3.9,-1.075 -3.9,0.025 -2.8,0.025 ; 7.6,-2.7 8,-2.7 8.7,-2 8.7,-0.8 ; 14.7,0.025 15.8,0.025 15.8,-1.075 ; 14.875,-3.562 15.275,-3.562 15.787,-3.05 15.787,-1.85
  text ".Designator" at 0.25,-2.575 h1.5

## M_53261-0419 [mm] "Molex 53261 series 1.25 mm pitch, 4 way, plug, Rev. 2"
height 3.4
pads (6):
  rrect50% 0.8x2 smd paste+0: 1(0,0.3) 2(1.25,0.3) 3(2.5,0.3) 4(3.75,0.3)
  rrect50% 2.1x3 smd: 5(-2.55,-2.9) 6(6.3,-2.9)
Top Overlay:
  lines w0.05: -1.5,-4.4 -3.2,-4.4 -3.2,-1.6 -1.5,-1.6 ; -0.2,-0.6 -0.2,0 0.2,0 0.2,-0.6 ; 1.05,-0.6 1.05,0 1.45,0 1.45,-0.6 ; 2.3,-0.6 2.3,0 2.7,0 2.7,-0.6 ; 3.55,-0.6 3.55,0 3.95,0 3.95,-0.6 ; 5.25,-4.4 6.95,-4.4 6.95,-1.6 5.25,-1.6 ; -1.5,-4.8 -1.5,-0.6 5.25,-0.6 5.25,-4.8 -1.5,-4.8
Mechanical 15:
  lines w0.2: -1.5,-1.2 -1.5,-0.6 -0.7,-0.6 ; 4.45,-0.6 5.25,-0.6 5.25,-1.2
  text ".Designator" at -1.25,-3.75 h1.5

## M_53261-0519 [mm] "Molex 53261 series 1.25 mm pitch, 5 way, plug, Rev. 2"
height 3.4
pads (7):
  rrect50% 0.8x2 smd paste+0: 1(0,0.3) 2(1.25,0.3) 3(2.5,0.3) 4(3.75,0.3) 5(5,0.3)
  rrect50% 2.1x3 smd: 6(-2.55,-2.9) 7(7.55,-2.9)
Top Overlay:
  lines w0.05: -1.5,-4.4 -3.2,-4.4 -3.2,-1.6 -1.5,-1.6 ; -0.2,-0.6 -0.2,0 0.2,0 0.2,-0.6 ; 1.05,-0.6 1.05,0 1.45,0 1.45,-0.6 ; 2.3,-0.6 2.3,0 2.7,0 2.7,-0.6 ; 3.55,-0.6 3.55,0 3.95,0 3.95,-0.6 ; 4.8,-0.6 4.8,0 5.2,0 5.2,-0.6 ; 6.5,-4.4 8.2,-4.4 8.2,-1.6 6.5,-1.6 ; -1.5,-4.8 6.5,-4.8 6.5,-0.6 -1.5,-0.6 -1.5,-4.8
Mechanical 15:
  lines w0.2: -1.5,-1.2 -1.5,-0.6 -0.7,-0.6 ; 5.7,-0.6 6.5,-0.6 6.5,-1.2
  text ".Designator" at -1.25,-3.75 h1.5

## M_53261-0619 [mm] "Molex 53261 series 1.25 mm pitch, 6 way, plug, Rev. 2"
height 3.4
pads (8):
  rrect50% 0.8x2 smd paste+0: 1(0,0.3) 2(1.25,0.3) 3(2.5,0.3) 4(3.75,0.3) 5(5,0.3) 6(6.25,0.3)
  rrect50% 2.1x3 smd: 7(-2.55,-2.9) 8(8.8,-2.9)
Top Overlay:
  lines w0.05: -1.5,-4.4 -3.2,-4.4 -3.2,-1.6 -1.5,-1.6 ; -0.2,-0.6 -0.2,0 0.2,0 0.2,-0.6 ; 1.05,-0.6 1.05,0 1.45,0 1.45,-0.6 ; 2.3,-0.6 2.3,0 2.7,0 2.7,-0.6 ; 3.55,-0.6 3.55,0 3.95,0 3.95,-0.6 ; 4.8,-0.6 4.8,0 5.2,0 5.2,-0.6 ; 6.05,-0.6 6.05,0 6.45,0 6.45,-0.6 ; 7.8,-4.4 9.5,-4.4 9.5,-1.6 7.8,-1.6 ; -1.5,-4.8 7.75,-4.8 7.75,-0.6 -1.5,-0.6 -1.5,-4.8
Mechanical 15:
  lines w0.2: -1.5,-1.2 -1.5,-0.6 -0.7,-0.6 ; 6.9,-0.6 7.7,-0.6 7.7,-1.2
  text ".Designator" at -1.25,-3.75 h1.5